# Altium schematic symbol library jlcpcb_2025_04_capacitors_extended_0402.schlib: 3594 symbols (part 17 of 20) (continued)
## GRT155C8YA224KE01D
designator C?  Capacitance: 220nF  (hidden comment: *)
Capacitor, Ceramic (MLCC), 220nF, ±10%, 35V, X6S, ±10%, SMD 0402; Manufacturer: Murata Electronics; Manufacturer Part Number: GRT155C8YA224KE01D; Package Size: 0402; JLCPCB Basic Part: No; JLCPCB Part Number: C711082; Supplier 1: LCSC; Category: Capacitors - MLCC; Supplier Part Number 1: C711082; Tolerance: ±10%; Voltage Rating: 35V; Temperature Coefficient: X6S; RoHS: Yes; ComponentLink1Description: Datasheet; ComponentLink1URL: https://wmsc.lcsc.com/wmsc/upload/file/pdf/v2/lcsc/2108202030_Murata-Electronics-GRT155C8YA224KE01D_C711082.pdf; ComponentLink2Description: JLCPCB Part URL; ComponentLink2URL: https://jlcpcb.com/partdetail/C711082; ComponentLink3Description: LCSC Part URL; ComponentLink3URL: https://lcsc.com/product-detail/Multilayer-Ceramic-Capacitors-MLCC---SMD-SMT_Murata-Electronics-Murata-Electronics-GRT155C8YA224KE01D_C711082.html
footprint CAP-0402 (0402 (1005M) Capacitor)
pins: 1, 2

## GRT155C70J225KE13D
designator C?  Capacitance: 2.2uF  (hidden comment: *)
Capacitor, Ceramic (MLCC), 2.2uF, ±10%, 6.3V, X7S, ±10%, SMD 0402; Manufacturer: Murata Electronics; Manufacturer Part Number: GRT155C70J225KE13D; Package Size: 0402; JLCPCB Basic Part: No; JLCPCB Part Number: C3900266; Supplier 1: LCSC; Category: Capacitors - MLCC; Supplier Part Number 1: C3900266; Tolerance: ±10%; Voltage Rating: 6.3V; Temperature Coefficient: X7S; RoHS: Yes; ComponentLink1Description: Datasheet; ComponentLink1URL: https://wmsc.lcsc.com/wmsc/upload/file/pdf/v2/lcsc/2308111805_Murata-Electronics-GRT155C70J225KE13D_C3900266.pdf; ComponentLink2Description: JLCPCB Part URL; ComponentLink2URL: https://jlcpcb.com/partdetail/C3900266; ComponentLink3Description: LCSC Part URL; ComponentLink3URL: https://lcsc.com/product-detail/Multilayer-Ceramic-Capacitors-MLCC---SMD-SMT_Murata-Electronics-Murata-Electronics-GRT155C70J225KE13D_C3900266.html
footprint CAP-0402 (0402 (1005M) Capacitor)
pins: 1, 2

## GRT155C71A105KE13D
designator C?  Capacitance: 1uF  (hidden comment: *)
Capacitor, Ceramic (MLCC), 1uF, ±10%, 10V, ±10%, SMD 0402; Manufacturer: Murata Electronics; Manufacturer Part Number: GRT155C71A105KE13D; Package Size: 0402; JLCPCB Basic Part: No; JLCPCB Part Number: C711077; Supplier 1: LCSC; Category: Capacitors - MLCC; Supplier Part Number 1: C711077; Tolerance: ±10%; Voltage Rating: 10V; RoHS: Yes; ComponentLink1Description: Datasheet; ComponentLink1URL: https://wmsc.lcsc.com/wmsc/upload/file/pdf/v2/lcsc/2101281807_Murata-Electronics-GRT155C71A105KE13D_C711077.pdf; ComponentLink2Description: JLCPCB Part URL; ComponentLink2URL: https://jlcpcb.com/partdetail/C711077; ComponentLink3Description: LCSC Part URL; ComponentLink3URL: https://lcsc.com/product-detail/Multilayer-Ceramic-Capacitors-MLCC---SMD-SMT_Murata-Electronics-Murata-Electronics-GRT155C71A105KE13D_C711077.html
footprint CAP-0402 (0402 (1005M) Capacitor)
pins: 1, 2

## GRT155C71A225KE13D
designator C?  Capacitance: 2.2uF  (hidden comment: *)
Capacitor, Ceramic (MLCC), 2.2uF, ±10%, 10V, X7S, ±10%, SMD 0402; Manufacturer: Murata Electronics; Manufacturer Part Number: GRT155C71A225KE13D; Package Size: 0402; JLCPCB Basic Part: No; JLCPCB Part Number: C415540; Supplier 1: LCSC; Category: Capacitors - MLCC; Supplier Part Number 1: C415540; Tolerance: ±10%; Voltage Rating: 10V; Temperature Coefficient: X7S; RoHS: Yes; ComponentLink1Description: Datasheet; ComponentLink1URL: https://wmsc.lcsc.com/wmsc/upload/file/pdf/v2/lcsc/1912111437_Murata-Electronics-GRT155C71A225KE13D_C415540.pdf; ComponentLink2Description: JLCPCB Part URL; ComponentLink2URL: https://jlcpcb.com/partdetail/C415540; ComponentLink3Description: LCSC Part URL; ComponentLink3URL: https://lcsc.com/product-detail/Multilayer-Ceramic-Capacitors-MLCC---SMD-SMT_Murata-Electronics-Murata-Electronics-GRT155C71A225KE13D_C415540.html
footprint CAP-0402 (0402 (1005M) Capacitor)
pins: 1, 2

## GRT155C80J225KE01D
designator C?  Capacitance: 2.2uF  (hidden comment: *)
Capacitor, Ceramic (MLCC), 2.2uF, ±10%, 6.3V, X6S, ±10%, SMD 0402; Manufacturer: Murata Electronics; Manufacturer Part Number: GRT155C80J225KE01D; Package Size: 0402; JLCPCB Basic Part: No; JLCPCB Part Number: C711079; Supplier 1: LCSC; Category: Capacitors - MLCC; Supplier Part Number 1: C711079; Tolerance: ±10%; Voltage Rating: 6.3V; Temperature Coefficient: X6S; RoHS: Yes; ComponentLink1Description: Datasheet; ComponentLink1URL: https://wmsc.lcsc.com/wmsc/upload/file/pdf/v2/lcsc/2308111644_Murata-Electronics-GRT155C80J225KE01D_C711079.pdf; ComponentLink2Description: JLCPCB Part URL; ComponentLink2URL: https://jlcpcb.com/partdetail/C711079; ComponentLink3Description: LCSC Part URL; ComponentLink3URL: https://lcsc.com/product-detail/Multilayer-Ceramic-Capacitors-MLCC---SMD-SMT_Murata-Electronics-Murata-Electronics-GRT155C80J225KE01D_C711079.html
footprint CAP-0402 (0402 (1005M) Capacitor)
pins: 1, 2

## GRT155C80J475ME13D
designator C?  Capacitance: 4.7uF  (hidden comment: *)
Capacitor, Ceramic (MLCC), 4.7uF, ±20%, 6.3V, X6S, ±20%, SMD 0402; Manufacturer: Murata Electronics; Manufacturer Part Number: GRT155C80J475ME13D; Package Size: 0402; JLCPCB Basic Part: No; JLCPCB Part Number: C711080; Supplier 1: LCSC; Category: Capacitors - MLCC; Supplier Part Number 1: C711080; Tolerance: ±20%; Voltage Rating: 6.3V; Temperature Coefficient: X6S; RoHS: Yes; ComponentLink1Description: Datasheet; ComponentLink1URL: https://wmsc.lcsc.com/wmsc/upload/file/pdf/v2/lcsc/2108241530_Murata-Electronics-GRT155C80J475ME13D_C711080.pdf; ComponentLink2Description: JLCPCB Part URL; ComponentLink2URL: https://jlcpcb.com/partdetail/C711080; ComponentLink3Description: LCSC Part URL; ComponentLink3URL: https://lcsc.com/product-detail/Multilayer-Ceramic-Capacitors-MLCC---SMD-SMT_Murata-Electronics-Murata-Electronics-GRT155C80J475ME13D_C711080.html
footprint CAP-0402 (0402 (1005M) Capacitor)
pins: 1, 2

## GRT155C81A105KE01D
designator C?  Capacitance: 1uF  (hidden comment: *)
Capacitor, Ceramic (MLCC), 1uF, ±10%, 10V, ±10%, SMD 0402; Manufacturer: Murata Electronics; Manufacturer Part Number: GRT155C81A105KE01D; Package Size: 0402; JLCPCB Basic Part: No; JLCPCB Part Number: C711579; Supplier 1: LCSC; Category: Capacitors - MLCC; Supplier Part Number 1: C711579; Tolerance: ±10%; Voltage Rating: 10V; RoHS: Yes; ComponentLink1Description: Datasheet; ComponentLink1URL: https://wmsc.lcsc.com/wmsc/upload/file/pdf/v2/lcsc/2304140030_Murata-Electronics-GRT155C81A105KE01D_C711579.pdf; ComponentLink2Description: JLCPCB Part URL; ComponentLink2URL: https://jlcpcb.com/partdetail/C711579; ComponentLink3Description: LCSC Part URL; ComponentLink3URL: https://lcsc.com/product-detail/Multilayer-Ceramic-Capacitors-MLCC---SMD-SMT_Murata-Electronics-Murata-Electronics-GRT155C81A105KE01D_C711579.html
footprint CAP-0402 (0402 (1005M) Capacitor)
pins: 1, 2

## GRT155C81C105KE13D
designator C?  Capacitance: 1uF  (hidden comment: *)
Capacitor, Ceramic (MLCC), 1uF, ±10%, 16V, ±10%, SMD 0402; Manufacturer: Murata Electronics; Manufacturer Part Number: GRT155C81C105KE13D; Package Size: 0402; JLCPCB Basic Part: No; JLCPCB Part Number: C908010; Supplier 1: LCSC; Category: Capacitors - MLCC; Supplier Part Number 1: C908010; Tolerance: ±10%; Voltage Rating: 16V; RoHS: Yes; ComponentLink1Description: Datasheet; ComponentLink1URL: https://wmsc.lcsc.com/wmsc/upload/file/pdf/v2/lcsc/2201242100_Murata-Electronics-GRT155C81C105KE13D_C908010.pdf; ComponentLink2Description: JLCPCB Part URL; ComponentLink2URL: https://jlcpcb.com/partdetail/C908010; ComponentLink3Description: LCSC Part URL; ComponentLink3URL: https://lcsc.com/product-detail/Multilayer-Ceramic-Capacitors-MLCC---SMD-SMT_Murata-Electronics-Murata-Electronics-GRT155C81C105KE13D_C908010.html
footprint CAP-0402 (0402 (1005M) Capacitor)
pins: 1, 2

## GRT155C81C225KE13D
designator C?  Capacitance: 2.2uF  (hidden comment: *)
Capacitor, Ceramic (MLCC), 2.2uF, ±10%, 16V, ±10%, SMD 0402; Manufacturer: Murata Electronics; Manufacturer Part Number: GRT155C81C225KE13D; Package Size: 0402; JLCPCB Basic Part: No; JLCPCB Part Number: C668369; Supplier 1: LCSC; Category: Capacitors - MLCC; Supplier Part Number 1: C668369; Tolerance: ±10%; Voltage Rating: 16V; RoHS: Yes; ComponentLink1Description: Datasheet; ComponentLink1URL: https://wmsc.lcsc.com/wmsc/upload/file/pdf/v2/lcsc/2105241313_Murata-Electronics-GRT155C81C225KE13D_C668369.pdf; ComponentLink2Description: JLCPCB Part URL; ComponentLink2URL: https://jlcpcb.com/partdetail/C668369; ComponentLink3Description: LCSC Part URL; ComponentLink3URL: https://lcsc.com/product-detail/Multilayer-Ceramic-Capacitors-MLCC---SMD-SMT_Murata-Electronics-Murata-Electronics-GRT155C81C225KE13D_C668369.html
footprint CAP-0402 (0402 (1005M) Capacitor)
pins: 1, 2

## GRT155C81E105KE13D
designator C?  Capacitance: 1uF  (hidden comment: *)
Capacitor, Ceramic (MLCC), 1uF, ±10%, 25V, ±10%, SMD 0402; Manufacturer: Murata Electronics; Manufacturer Part Number: GRT155C81E105KE13D; Package Size: 0402; JLCPCB Basic Part: No; JLCPCB Part Number: C703147; Supplier 1: LCSC; Category: Capacitors - MLCC; Supplier Part Number 1: C703147; Tolerance: ±10%; Voltage Rating: 25V; RoHS: Yes; ComponentLink1Description: Datasheet; ComponentLink1URL: https://wmsc.lcsc.com/wmsc/upload/file/pdf/v2/lcsc/2308111644_Murata-Electronics-GRT155C81E105KE13D_C703147.pdf; ComponentLink2Description: JLCPCB Part URL; ComponentLink2URL: https://jlcpcb.com/partdetail/C703147; ComponentLink3Description: LCSC Part URL; ComponentLink3URL: https://lcsc.com/product-detail/Multilayer-Ceramic-Capacitors-MLCC---SMD-SMT_Murata-Electronics-Murata-Electronics-GRT155C81E105KE13D_C703147.html
footprint CAP-0402 (0402 (1005M) Capacitor)
pins: 1, 2

## GRT155C81E224KE01D
designator C?  Capacitance: 220nF  (hidden comment: *)
Capacitor, Ceramic (MLCC), 220nF, ±10%, 25V, X6S, ±10%, SMD 0402; Manufacturer: Murata Electronics; Manufacturer Part Number: GRT155C81E224KE01D; Package Size: 0402; JLCPCB Basic Part: No; JLCPCB Part Number: C126623; Supplier 1: LCSC; Category: Capacitors - MLCC; Supplier Part Number 1: C126623; Tolerance: ±10%; Voltage Rating: 25V; Temperature Coefficient: X6S; RoHS: Yes; ComponentLink1Description: Datasheet; ComponentLink1URL: https://wmsc.lcsc.com/wmsc/upload/file/pdf/v2/lcsc/1811081510_Murata-Electronics-GRT155C81E224KE01D_C126623.pdf; ComponentLink2Description: JLCPCB Part URL; ComponentLink2URL: https://jlcpcb.com/partdetail/C126623; ComponentLink3Description: LCSC Part URL; ComponentLink3URL: https://lcsc.com/product-detail/Multilayer-Ceramic-Capacitors-MLCC---SMD-SMT_Murata-Electronics-Murata-Electronics-GRT155C81E224KE01D_C126623.html
footprint CAP-0402 (0402 (1005M) Capacitor)
pins: 1, 2

## GRT155R6YA224KE01D
designator C?  Capacitance: 0.22uF  (hidden comment: *)
Capacitor, Ceramic (MLCC), 0.22uF, ±10%, 35V, X5R, ±10%, SMD 0402; Manufacturer: Murata Electronics; Manufacturer Part Number: GRT155R6YA224KE01D; Package Size: 0402; JLCPCB Basic Part: No; JLCPCB Part Number: C180396; Supplier 1: LCSC; Category: Capacitors - MLCC; Supplier Part Number 1: C180396; Tolerance: ±10%; Voltage Rating: 35V; Temperature Coefficient: X5R; RoHS: Yes; ComponentLink1Description: Datasheet; ComponentLink1URL: https://wmsc.lcsc.com/wmsc/upload/file/pdf/v2/lcsc/2304140030_Murata-Electronics-GRT155R6YA224KE01D_C180396.pdf; ComponentLink2Description: JLCPCB Part URL; ComponentLink2URL: https://jlcpcb.com/partdetail/C180396; ComponentLink3Description: LCSC Part URL; ComponentLink3URL: https://lcsc.com/product-detail/Multilayer-Ceramic-Capacitors-MLCC---SMD-SMT_Murata-Electronics-Murata-Electronics-GRT155R6YA224KE01D_C180396.html
footprint CAP-0402 (0402 (1005M) Capacitor)
pins: 1, 2

## GRT155R6YA474KE01D
designator C?  Capacitance: 470nF  (hidden comment: *)
Capacitor, Ceramic (MLCC), 470nF, ±10%, 35V, X5R, ±10%, SMD 0402; Manufacturer: Murata Electronics; Manufacturer Part Number: GRT155R6YA474KE01D; Package Size: 0402; JLCPCB Basic Part: No; JLCPCB Part Number: C711580; Supplier 1: LCSC; Category: Capacitors - MLCC; Supplier Part Number 1: C711580; Tolerance: ±10%; Voltage Rating: 35V; Temperature Coefficient: X5R; RoHS: Yes; ComponentLink1Description: Datasheet; ComponentLink1URL: https://wmsc.lcsc.com/wmsc/upload/file/pdf/v2/lcsc/2010302040_Murata-Electronics-GRT155R6YA474KE01D_C711580.pdf; ComponentLink2Description: JLCPCB Part URL; ComponentLink2URL: https://jlcpcb.com/partdetail/C711580; ComponentLink3Description: LCSC Part URL; ComponentLink3URL: https://lcsc.com/product-detail/Multilayer-Ceramic-Capacitors-MLCC---SMD-SMT_Murata-Electronics-Murata-Electronics-GRT155R6YA474KE01D_C711580.html
footprint CAP-0402 (0402 (1005M) Capacitor)
pins: 1, 2

## GRT155R60J105KE01D
designator C?  Capacitance: 1uF  (hidden comment: *)
Capacitor, Ceramic (MLCC), 1uF, ±10%, 6.3V, X5R, ±10%, SMD 0402; Manufacturer: Murata Electronics; Manufacturer Part Number: GRT155R60J105KE01D; Package Size: 0402; JLCPCB Basic Part: No; JLCPCB Part Number: C430715; Supplier 1: LCSC; Category: Capacitors - MLCC; Supplier Part Number 1: C430715; Tolerance: ±10%; Voltage Rating: 6.3V; Temperature Coefficient: X5R; RoHS: Yes; ComponentLink1Description: Datasheet; ComponentLink1URL: https://wmsc.lcsc.com/wmsc/upload/file/pdf/v2/lcsc/1912111437_Murata-Electronics-GRT155R60J105KE01D_C430715.pdf; ComponentLink2Description: JLCPCB Part URL; ComponentLink2URL: https://jlcpcb.com/partdetail/C430715; ComponentLink3Description: LCSC Part URL; ComponentLink3URL: https://lcsc.com/product-detail/Multilayer-Ceramic-Capacitors-MLCC---SMD-SMT_Murata-Electronics-Murata-Electronics-GRT155R60J105KE01D_C430715.html
footprint CAP-0402 (0402 (1005M) Capacitor)
pins: 1, 2

## GRT155R60J225KE01D
designator C?  Capacitance: 2.2uF  (hidden comment: *)
Capacitor, Ceramic (MLCC), 2.2uF, ±10%, 6.3V, X5R, ±10%, SMD 0402; Manufacturer: Murata Electronics; Manufacturer Part Number: GRT155R60J225KE01D; Package Size: 0402; JLCPCB Basic Part: No; JLCPCB Part Number: C711083; Supplier 1: LCSC; Category: Capacitors - MLCC; Supplier Part Number 1: C711083; Tolerance: ±10%; Voltage Rating: 6.3V; Temperature Coefficient: X5R; RoHS: Yes; ComponentLink1Description: Datasheet; ComponentLink1URL: https://wmsc.lcsc.com/wmsc/upload/file/pdf/v2/lcsc/2009181536_Murata-Electronics-GRT155R60J225KE01D_C711083.pdf; ComponentLink2Description: JLCPCB Part URL; ComponentLink2URL: https://jlcpcb.com/partdetail/C711083; ComponentLink3Description: LCSC Part URL; ComponentLink3URL: https://lcsc.com/product-detail/Multilayer-Ceramic-Capacitors-MLCC---SMD-SMT_Murata-Electronics-Murata-Electronics-GRT155R60J225KE01D_C711083.html
footprint CAP-0402 (0402 (1005M) Capacitor)
pins: 1, 2

## GRT155R60J475ME13D
designator C?  Capacitance: 4.7uF  (hidden comment: *)
Capacitor, Ceramic (MLCC), 4.7uF, ±20%, 6.3V, X5R, ±20%, SMD 0402; Manufacturer: Murata Electronics; Manufacturer Part Number: GRT155R60J475ME13D; Package Size: 0402; JLCPCB Basic Part: No; JLCPCB Part Number: C126624; Supplier 1: LCSC; Category: Capacitors - MLCC; Supplier Part Number 1: C126624; Tolerance: ±20%; Voltage Rating: 6.3V; Temperature Coefficient: X5R; RoHS: Yes; ComponentLink1Description: Datasheet; ComponentLink1URL: https://wmsc.lcsc.com/wmsc/upload/file/pdf/v2/lcsc/1811081510_Murata-Electronics-GRT155R60J475ME13D_C126624.pdf; ComponentLink2Description: JLCPCB Part URL; ComponentLink2URL: https://jlcpcb.com/partdetail/C126624; ComponentLink3Description: LCSC Part URL; ComponentLink3URL: https://lcsc.com/product-detail/Multilayer-Ceramic-Capacitors-MLCC---SMD-SMT_Murata-Electronics-Murata-Electronics-GRT155R60J475ME13D_C126624.html
footprint CAP-0402 (0402 (1005M) Capacitor)
pins: 1, 2

## GRT155R61A105KE01D
designator C?  Capacitance: 1uF  (hidden comment: *)
Capacitor, Ceramic (MLCC), 1uF, ±10%, 10V, X5R, ±10%, SMD 0402; Manufacturer: Murata Electronics; Manufacturer Part Number: GRT155R61A105KE01D; Package Size: 0402; JLCPCB Basic Part: No; JLCPCB Part Number: C430716; Supplier 1: LCSC; Category: Capacitors - MLCC; Supplier Part Number 1: C430716; Tolerance: ±10%; Voltage Rating: 10V; Temperature Coefficient: X5R; RoHS: Yes; ComponentLink1Description: Datasheet; ComponentLink1URL: https://wmsc.lcsc.com/wmsc/upload/file/pdf/v2/lcsc/1912111437_Murata-Electronics-GRT155R61A105KE01D_C430716.pdf; ComponentLink2Description: JLCPCB Part URL; ComponentLink2URL: https://jlcpcb.com/partdetail/C430716; ComponentLink3Description: LCSC Part URL; ComponentLink3URL: https://lcsc.com/product-detail/Multilayer-Ceramic-Capacitors-MLCC---SMD-SMT_Murata-Electronics-Murata-Electronics-GRT155R61A105KE01D_C430716.html
footprint CAP-0402 (0402 (1005M) Capacitor)
pins: 1, 2

## GRT155R61A225KE01D
designator C?  Capacitance: 2.2uF  (hidden comment: *)
Capacitor, Ceramic (MLCC), 2.2uF, ±10%, 10V, X5R, ±10%, SMD 0402; Manufacturer: Murata Electronics; Manufacturer Part Number: GRT155R61A225KE01D; Package Size: 0402; JLCPCB Basic Part: No; JLCPCB Part Number: C426070; Supplier 1: LCSC; Category: Capacitors - MLCC; Supplier Part Number 1: C426070; Tolerance: ±10%; Voltage Rating: 10V; Temperature Coefficient: X5R; RoHS: Yes; ComponentLink1Description: Datasheet; ComponentLink1URL: https://wmsc.lcsc.com/wmsc/upload/file/pdf/v2/lcsc/2304140030_Murata-Electronics-GRT155R61A225KE01D_C426070.pdf; ComponentLink2Description: JLCPCB Part URL; ComponentLink2URL: https://jlcpcb.com/partdetail/C426070; ComponentLink3Description: LCSC Part URL; ComponentLink3URL: https://lcsc.com/product-detail/Multilayer-Ceramic-Capacitors-MLCC---SMD-SMT_Murata-Electronics-Murata-Electronics-GRT155R61A225KE01D_C426070.html
footprint CAP-0402 (0402 (1005M) Capacitor)
pins: 1, 2

## GRT155R61A475ME13D
designator C?  Capacitance: 4.7uF  (hidden comment: *)
Capacitor, Ceramic (MLCC), 4.7uF, ±20%, 10V, ±20%, SMD 0402; Manufacturer: Murata Electronics; Manufacturer Part Number: GRT155R61A475ME13D; Package Size: 0402; JLCPCB Basic Part: No; JLCPCB Part Number: C426101; Supplier 1: LCSC; Category: Capacitors - MLCC; Supplier Part Number 1: C426101; Tolerance: ±20%; Voltage Rating: 10V; RoHS: Yes; ComponentLink1Description: Datasheet; ComponentLink1URL: https://wmsc.lcsc.com/wmsc/upload/file/pdf/v2/lcsc/2304140030_Murata-Electronics-GRT155R61A475ME13D_C426101.pdf; ComponentLink2Description: JLCPCB Part URL; ComponentLink2URL: https://jlcpcb.com/partdetail/C426101; ComponentLink3Description: LCSC Part URL; ComponentLink3URL: https://lcsc.com/product-detail/Multilayer-Ceramic-Capacitors-MLCC---SMD-SMT_Murata-Electronics-Murata-Electronics-GRT155R61A475ME13D_C426101.html
footprint CAP-0402 (0402 (1005M) Capacitor)
pins: 1, 2

## GRT155R61C105KE01D
designator C?  Capacitance: 1uF  (hidden comment: *)
Capacitor, Ceramic (MLCC), 1uF, ±10%, 16V, X5R, ±10%, SMD 0402; Manufacturer: Murata Electronics; Manufacturer Part Number: GRT155R61C105KE01D; Package Size: 0402; JLCPCB Basic Part: No; JLCPCB Part Number: C363938; Supplier 1: LCSC; Category: Capacitors - MLCC; Supplier Part Number 1: C363938; Tolerance: ±10%; Voltage Rating: 16V; Temperature Coefficient: X5R; RoHS: Yes; ComponentLink1Description: Datasheet; ComponentLink1URL: https://wmsc.lcsc.com/wmsc/upload/file/pdf/v2/lcsc/1912111437_Murata-Electronics-GRT155R61C105KE01D_C363938.pdf; ComponentLink2Description: JLCPCB Part URL; ComponentLink2URL: https://jlcpcb.com/partdetail/C363938; ComponentLink3Description: LCSC Part URL; ComponentLink3URL: https://lcsc.com/product-detail/Multilayer-Ceramic-Capacitors-MLCC---SMD-SMT_Murata-Electronics-Murata-Electronics-GRT155R61C105KE01D_C363938.html
footprint CAP-0402 (0402 (1005M) Capacitor)
pins: 1, 2

## GRT155R61C225KE13D
designator C?  Capacitance: 2.2uF  (hidden comment: *)
Capacitor, Ceramic (MLCC), 2.2uF, ±10%, 16V, X5R, ±10%, SMD 0402; Manufacturer: Murata Electronics; Manufacturer Part Number: GRT155R61C225KE13D; Package Size: 0402; JLCPCB Basic Part: No; JLCPCB Part Number: C711084; Supplier 1: LCSC; Category: Capacitors - MLCC; Supplier Part Number 1: C711084; Tolerance: ±10%; Voltage Rating: 16V; Temperature Coefficient: X5R; RoHS: Yes; ComponentLink1Description: Datasheet; ComponentLink1URL: https://wmsc.lcsc.com/wmsc/upload/file/pdf/v2/lcsc/2206281745_Murata-Electronics-GRT155R61C225KE13D_C711084.pdf; ComponentLink2Description: JLCPCB Part URL; ComponentLink2URL: https://jlcpcb.com/partdetail/C711084; ComponentLink3Description: LCSC Part URL; ComponentLink3URL: https://lcsc.com/product-detail/Multilayer-Ceramic-Capacitors-MLCC---SMD-SMT_Murata-Electronics-Murata-Electronics-GRT155R61C225KE13D_C711084.html
footprint CAP-0402 (0402 (1005M) Capacitor)
pins: 1, 2

## GRT155R61C474KE01D
designator C?  Capacitance: 470nF  (hidden comment: *)
Capacitor, Ceramic (MLCC), 470nF, ±10%, 16V, X5R, ±10%, SMD 0402; Manufacturer: Murata Electronics; Manufacturer Part Number: GRT155R61C474KE01D; Package Size: 0402; JLCPCB Basic Part: No; JLCPCB Part Number: C126625; Supplier 1: LCSC; Category: Capacitors - MLCC; Supplier Part Number 1: C126625; Tolerance: ±10%; Voltage Rating: 16V; Temperature Coefficient: X5R; RoHS: Yes; ComponentLink1Description: Datasheet; ComponentLink1URL: https://wmsc.lcsc.com/wmsc/upload/file/pdf/v2/lcsc/1912111437_Murata-Electronics-GRT155R61C474KE01D_C126625.pdf; ComponentLink2Description: JLCPCB Part URL; ComponentLink2URL: https://jlcpcb.com/partdetail/C126625; ComponentLink3Description: LCSC Part URL; ComponentLink3URL: https://lcsc.com/product-detail/Multilayer-Ceramic-Capacitors-MLCC---SMD-SMT_Murata-Electronics-Murata-Electronics-GRT155R61C474KE01D_C126625.html
footprint CAP-0402 (0402 (1005M) Capacitor)
pins: 1, 2

## GRT155R61E105KE01D
designator C?  Capacitance: 1uF  (hidden comment: *)
Capacitor, Ceramic (MLCC), 1uF, ±10%, 25V, X5R, ±10%, SMD 0402; Manufacturer: Murata Electronics; Manufacturer Part Number: GRT155R61E105KE01D; Package Size: 0402; JLCPCB Basic Part: No; JLCPCB Part Number: C711085; Supplier 1: LCSC; Category: Capacitors - MLCC; Supplier Part Number 1: C711085; Tolerance: ±10%; Voltage Rating: 25V; Temperature Coefficient: X5R; RoHS: Yes; ComponentLink1Description: Datasheet; ComponentLink1URL: https://wmsc.lcsc.com/wmsc/upload/file/pdf/v2/lcsc/2101081033_Murata-Electronics-GRT155R61E105KE01D_C711085.pdf; ComponentLink2Description: JLCPCB Part URL; ComponentLink2URL: https://jlcpcb.com/partdetail/C711085; ComponentLink3Description: LCSC Part URL; ComponentLink3URL: https://lcsc.com/product-detail/Multilayer-Ceramic-Capacitors-MLCC---SMD-SMT_Murata-Electronics-Murata-Electronics-GRT155R61E105KE01D_C711085.html
footprint CAP-0402 (0402 (1005M) Capacitor)
pins: 1, 2

## GRT155R61E224KE01D
designator C?  Capacitance: 220nF  (hidden comment: *)
Capacitor, Ceramic (MLCC), 220nF, ±10%, 25V, ±10%, SMD 0402; Manufacturer: Murata Electronics; Manufacturer Part Number: GRT155R61E224KE01D; Package Size: 0402; JLCPCB Basic Part: No; JLCPCB Part Number: C180397; Supplier 1: LCSC; Category: Capacitors - MLCC; Supplier Part Number 1: C180397; Tolerance: ±10%; Voltage Rating: 25V; RoHS: Yes; ComponentLink1Description: Datasheet; ComponentLink1URL: https://wmsc.lcsc.com/wmsc/upload/file/pdf/v2/lcsc/2009081704_Murata-Electronics-GRT155R61E224KE01D_C180397.pdf; ComponentLink2Description: JLCPCB Part URL; ComponentLink2URL: https://jlcpcb.com/partdetail/C180397; ComponentLink3Description: LCSC Part URL; ComponentLink3URL: https://lcsc.com/product-detail/Multilayer-Ceramic-Capacitors-MLCC---SMD-SMT_Murata-Electronics-Murata-Electronics-GRT155R61E224KE01D_C180397.html
footprint CAP-0402 (0402 (1005M) Capacitor)
pins: 1, 2

## GRT155R61E225KE13D
designator C?  Capacitance: 2.2uF  (hidden comment: *)
Capacitor, Ceramic (MLCC), 2.2uF, ±10%, 25V, X5R, ±10%, SMD 0402; Manufacturer: Murata Electronics; Manufacturer Part Number: GRT155R61E225KE13D; Package Size: 0402; JLCPCB Basic Part: No; JLCPCB Part Number: C711086; Supplier 1: LCSC; Category: Capacitors - MLCC; Supplier Part Number 1: C711086; Tolerance: ±10%; Voltage Rating: 25V; Temperature Coefficient: X5R; RoHS: Yes; ComponentLink1Description: Datasheet; ComponentLink1URL: https://wmsc.lcsc.com/wmsc/upload/file/pdf/v2/lcsc/2308111644_Murata-Electronics-GRT155R61E225KE13D_C711086.pdf; ComponentLink2Description: JLCPCB Part URL; ComponentLink2URL: https://jlcpcb.com/partdetail/C711086; ComponentLink3Description: LCSC Part URL; ComponentLink3URL: https://lcsc.com/product-detail/Multilayer-Ceramic-Capacitors-MLCC---SMD-SMT_Murata-Electronics-Murata-Electronics-GRT155R61E225KE13D_C711086.html
footprint CAP-0402 (0402 (1005M) Capacitor)
pins: 1, 2

## GRT155R61E474KE01D
designator C?  Capacitance: 470nF  (hidden comment: *)
Capacitor, Ceramic (MLCC), 470nF, ±10%, 25V, X5R, ±10%, SMD 0402; Manufacturer: Murata Electronics; Manufacturer Part Number: GRT155R61E474KE01D; Package Size: 0402; JLCPCB Basic Part: No; JLCPCB Part Number: C782164; Supplier 1: LCSC; Category: Capacitors - MLCC; Supplier Part Number 1: C782164; Tolerance: ±10%; Voltage Rating: 25V; Temperature Coefficient: X5R; RoHS: Yes; ComponentLink1Description: Datasheet; ComponentLink1URL: https://wmsc.lcsc.com/wmsc/upload/file/pdf/v2/lcsc/2009161209_Murata-Electronics-GRT155R61E474KE01D_C782164.pdf; ComponentLink2Description: JLCPCB Part URL; ComponentLink2URL: https://jlcpcb.com/partdetail/C782164; ComponentLink3Description: LCSC Part URL; ComponentLink3URL: https://lcsc.com/product-detail/Multilayer-Ceramic-Capacitors-MLCC---SMD-SMT_Murata-Electronics-Murata-Electronics-GRT155R61E474KE01D_C782164.html
footprint CAP-0402 (0402 (1005M) Capacitor)
pins: 1, 2

## GRT155R70J105KE01D
designator C?  Capacitance: 1uF  (hidden comment: *)
Capacitor, Ceramic (MLCC), 1uF, ±10%, 6.3V, ±10%, SMD 0402; Manufacturer: Murata Electronics; Manufacturer Part Number: GRT155R70J105KE01D; Package Size: 0402; JLCPCB Basic Part: No; JLCPCB Part Number: C711581; Supplier 1: LCSC; Category: Capacitors - MLCC; Supplier Part Number 1: C711581; Tolerance: ±10%; Voltage Rating: 6.3V; RoHS: Yes; ComponentLink1Description: Datasheet; ComponentLink1URL: https://wmsc.lcsc.com/wmsc/upload/file/pdf/v2/lcsc/2009261437_Murata-Electronics-GRT155R70J105KE01D_C711581.pdf; ComponentLink2Description: JLCPCB Part URL; ComponentLink2URL: https://jlcpcb.com/partdetail/C711581; ComponentLink3Description: LCSC Part URL; ComponentLink3URL: https://lcsc.com/product-detail/Multilayer-Ceramic-Capacitors-MLCC---SMD-SMT_Murata-Electronics-Murata-Electronics-GRT155R70J105KE01D_C711581.html
footprint CAP-0402 (0402 (1005M) Capacitor)
pins: 1, 2

## GRT155R71A474KE01D
designator C?  Capacitance: 470nF  (hidden comment: *)
Capacitor, Ceramic (MLCC), 470nF, ±10%, 10V, X7R, ±10%, SMD 0402; Manufacturer: Murata Electronics; Manufacturer Part Number: GRT155R71A474KE01D; Package Size: 0402; JLCPCB Basic Part: No; JLCPCB Part Number: C711087; Supplier 1: LCSC; Category: Capacitors - MLCC; Supplier Part Number 1: C711087; Tolerance: ±10%; Voltage Rating: 10V; Temperature Coefficient: X7R; RoHS: Yes; ComponentLink1Description: Datasheet; ComponentLink1URL: https://wmsc.lcsc.com/wmsc/upload/file/pdf/v2/lcsc/2206281830_Murata-Electronics-GRT155R71A474KE01D_C711087.pdf; ComponentLink2Description: JLCPCB Part URL; ComponentLink2URL: https://jlcpcb.com/partdetail/C711087; ComponentLink3Description: LCSC Part URL; ComponentLink3URL: https://lcsc.com/product-detail/Multilayer-Ceramic-Capacitors-MLCC---SMD-SMT_Murata-Electronics-Murata-Electronics-GRT155R71A474KE01D_C711087.html
footprint CAP-0402 (0402 (1005M) Capacitor)
pins: 1, 2

## GRT155R71C104KE01D
designator C?  Capacitance: 100nF  (hidden comment: *)
Capacitor, Ceramic (MLCC), 100nF, ±10%, 16V, ±10%, SMD 0402; Manufacturer: Murata Electronics; Manufacturer Part Number: GRT155R71C104KE01D; Package Size: 0402; JLCPCB Basic Part: No; JLCPCB Part Number: C711088; Supplier 1: LCSC; Category: Capacitors - MLCC; Supplier Part Number 1: C711088; Tolerance: ±10%; Voltage Rating: 16V; RoHS: Yes; ComponentLink1Description: Datasheet; ComponentLink1URL: https://wmsc.lcsc.com/wmsc/upload/file/pdf/v2/lcsc/2009181536_Murata-Electronics-GRT155R71C104KE01D_C711088.pdf; ComponentLink2Description: JLCPCB Part URL; ComponentLink2URL: https://jlcpcb.com/partdetail/C711088; ComponentLink3Description: LCSC Part URL; ComponentLink3URL: https://lcsc.com/product-detail/Multilayer-Ceramic-Capacitors-MLCC---SMD-SMT_Murata-Electronics-Murata-Electronics-GRT155R71C104KE01D_C711088.html
footprint CAP-0402 (0402 (1005M) Capacitor)
pins: 1, 2

## GRT155R71H102KE01D
designator C?  Capacitance: 1000pF  (hidden comment: *)
Capacitor, Ceramic (MLCC), 1000pF, ±10%, null, X7R, ±10%, SMD 0402; Manufacturer: Murata Electronics; Manufacturer Part Number: GRT155R71H102KE01D; Package Size: 0402; JLCPCB Basic Part: No; JLCPCB Part Number: C711089; Supplier 1: LCSC; Category: Capacitors - MLCC; Supplier Part Number 1: C711089; Tolerance: ±10%; Voltage Rating: null; Temperature Coefficient: X7R; RoHS: Yes; ComponentLink1Description: Datasheet; ComponentLink1URL: https://wmsc.lcsc.com/wmsc/upload/file/pdf/v2/lcsc/2308111644_Murata-Electronics-GRT155R71H102KE01D_C711089.pdf; ComponentLink2Description: JLCPCB Part URL; ComponentLink2URL: https://jlcpcb.com/partdetail/C711089; ComponentLink3Description: LCSC Part URL; ComponentLink3URL: https://lcsc.com/product-detail/Multilayer-Ceramic-Capacitors-MLCC---SMD-SMT_Murata-Electronics-Murata-Electronics-GRT155R71H102KE01D_C711089.html
footprint CAP-0402 (0402 (1005M) Capacitor)
pins: 1, 2

## GRT155R71H103KE01D
designator C?  Capacitance: 10nF  (hidden comment: *)
Capacitor, Ceramic (MLCC), 10nF, ±10%, null, X7R, ±10%, SMD 0402; Manufacturer: Murata Electronics; Manufacturer Part Number: GRT155R71H103KE01D; Package Size: 0402; JLCPCB Basic Part: No; JLCPCB Part Number: C711090; Supplier 1: LCSC; Category: Capacitors - MLCC; Supplier Part Number 1: C711090; Tolerance: ±10%; Voltage Rating: null; Temperature Coefficient: X7R; RoHS: Yes; ComponentLink1Description: Datasheet; ComponentLink1URL: https://wmsc.lcsc.com/wmsc/upload/file/pdf/v2/lcsc/2009181536_Murata-Electronics-GRT155R71H103KE01D_C711090.pdf; ComponentLink2Description: JLCPCB Part URL; ComponentLink2URL: https://jlcpcb.com/partdetail/C711090; ComponentLink3Description: LCSC Part URL; ComponentLink3URL: https://lcsc.com/product-detail/Multilayer-Ceramic-Capacitors-MLCC---SMD-SMT_Murata-Electronics-Murata-Electronics-GRT155R71H103KE01D_C711090.html
footprint CAP-0402 (0402 (1005M) Capacitor)
pins: 1, 2

## GRT155R71H104KE01D
designator C?  Capacitance: 100nF  (hidden comment: *)
Capacitor, Ceramic (MLCC), 100nF, ±10%, null, ±10%, SMD 0402; Manufacturer: Murata Electronics; Manufacturer Part Number: GRT155R71H104KE01D; Package Size: 0402; JLCPCB Basic Part: No; JLCPCB Part Number: C711091; Supplier 1: LCSC; Category: Capacitors - MLCC; Supplier Part Number 1: C711091; Tolerance: ±10%; Voltage Rating: null; RoHS: Yes; ComponentLink1Description: Datasheet; ComponentLink1URL: https://wmsc.lcsc.com/wmsc/upload/file/pdf/v2/lcsc/2009181536_Murata-Electronics-GRT155R71H104KE01D_C711091.pdf; ComponentLink2Description: JLCPCB Part URL; ComponentLink2URL: https://jlcpcb.com/partdetail/C711091; ComponentLink3Description: LCSC Part URL; ComponentLink3URL: https://lcsc.com/product-detail/Multilayer-Ceramic-Capacitors-MLCC---SMD-SMT_Murata-Electronics-Murata-Electronics-GRT155R71H104KE01D_C711091.html
footprint CAP-0402 (0402 (1005M) Capacitor)
pins: 1, 2

## GRT155R71H152KE01D
designator C?  Capacitance: 1.5nF  (hidden comment: *)
Capacitor, Ceramic (MLCC), 1.5nF, ±10%, 50V, X7R, ±10%, SMD 0402; Manufacturer: Murata Electronics; Manufacturer Part Number: GRT155R71H152KE01D; Package Size: 0402; JLCPCB Basic Part: No; JLCPCB Part Number: C782166; Supplier 1: LCSC; Category: Capacitors - MLCC; Supplier Part Number 1: C782166; Tolerance: ±10%; Voltage Rating: 50V; Temperature Coefficient: X7R; RoHS: Yes; ComponentLink1Description: Datasheet; ComponentLink1URL: https://wmsc.lcsc.com/wmsc/upload/file/pdf/v2/lcsc/2009161209_Murata-Electronics-GRT155R71H152KE01D_C782166.pdf; ComponentLink2Description: JLCPCB Part URL; ComponentLink2URL: https://jlcpcb.com/partdetail/C782166; ComponentLink3Description: LCSC Part URL; ComponentLink3URL: https://lcsc.com/product-detail/Multilayer-Ceramic-Capacitors-MLCC---SMD-SMT_Murata-Electronics-Murata-Electronics-GRT155R71H152KE01D_C782166.html
footprint CAP-0402 (0402 (1005M) Capacitor)
pins: 1, 2

## GRT155R71H222KE01D
designator C?  Capacitance: 2.2nF  (hidden comment: *)
Capacitor, Ceramic (MLCC), 2.2nF, ±10%, null, ±10%, SMD 0402; Manufacturer: Murata Electronics; Manufacturer Part Number: GRT155R71H222KE01D; Package Size: 0402; JLCPCB Basic Part: No; JLCPCB Part Number: C782167; Supplier 1: LCSC; Category: Capacitors - MLCC; Supplier Part Number 1: C782167; Tolerance: ±10%; Voltage Rating: null; RoHS: Yes; ComponentLink1Description: Datasheet; ComponentLink1URL: https://wmsc.lcsc.com/wmsc/upload/file/pdf/v2/lcsc/2009161209_Murata-Electronics-GRT155R71H222KE01D_C782167.pdf; ComponentLink2Description: JLCPCB Part URL; ComponentLink2URL: https://jlcpcb.com/partdetail/C782167; ComponentLink3Description: LCSC Part URL; ComponentLink3URL: https://lcsc.com/product-detail/Multilayer-Ceramic-Capacitors-MLCC---SMD-SMT_Murata-Electronics-Murata-Electronics-GRT155R71H222KE01D_C782167.html
footprint CAP-0402 (0402 (1005M) Capacitor)
pins: 1, 2

## GRT155R71H223KE01D
designator C?  Capacitance: 22nF  (hidden comment: *)
Capacitor, Ceramic (MLCC), 22nF, ±10%, null, X7R, ±10%, SMD 0402; Manufacturer: Murata Electronics; Manufacturer Part Number: GRT155R71H223KE01D; Package Size: 0402; JLCPCB Basic Part: No; JLCPCB Part Number: C711092; Supplier 1: LCSC; Category: Capacitors - MLCC; Supplier Part Number 1: C711092; Tolerance: ±10%; Voltage Rating: null; Temperature Coefficient: X7R; RoHS: Yes; ComponentLink1Description: Datasheet; ComponentLink1URL: https://wmsc.lcsc.com/wmsc/upload/file/pdf/v2/lcsc/2009181536_Murata-Electronics-GRT155R71H223KE01D_C711092.pdf; ComponentLink2Description: JLCPCB Part URL; ComponentLink2URL: https://jlcpcb.com/partdetail/C711092; ComponentLink3Description: LCSC Part URL; ComponentLink3URL: https://lcsc.com/product-detail/Multilayer-Ceramic-Capacitors-MLCC---SMD-SMT_Murata-Electronics-Murata-Electronics-GRT155R71H223KE01D_C711092.html
footprint CAP-0402 (0402 (1005M) Capacitor)
pins: 1, 2

## GRT155R71H332KE01D
designator C?  Capacitance: 3.3nF  (hidden comment: *)
Capacitor, Ceramic (MLCC), 3.3nF, ±10%, null, ±10%, SMD 0402; Manufacturer: Murata Electronics; Manufacturer Part Number: GRT155R71H332KE01D; Package Size: 0402; JLCPCB Basic Part: No; JLCPCB Part Number: C782168; Supplier 1: LCSC; Category: Capacitors - MLCC; Supplier Part Number 1: C782168; Tolerance: ±10%; Voltage Rating: null; RoHS: Yes; ComponentLink1Description: Datasheet; ComponentLink1URL: https://wmsc.lcsc.com/wmsc/upload/file/pdf/v2/lcsc/2009161209_Murata-Electronics-GRT155R71H332KE01D_C782168.pdf; ComponentLink2Description: JLCPCB Part URL; ComponentLink2URL: https://jlcpcb.com/partdetail/C782168; ComponentLink3Description: LCSC Part URL; ComponentLink3URL: https://lcsc.com/product-detail/Multilayer-Ceramic-Capacitors-MLCC---SMD-SMT_Murata-Electronics-Murata-Electronics-GRT155R71H332KE01D_C782168.html
footprint CAP-0402 (0402 (1005M) Capacitor)
pins: 1, 2

## GRT155R71H473KE01D
designator C?  Capacitance: 47nF  (hidden comment: *)
Capacitor, Ceramic (MLCC), 47nF, ±10%, null, ±10%, SMD 0402; Manufacturer: Murata Electronics; Manufacturer Part Number: GRT155R71H473KE01D; Package Size: 0402; JLCPCB Basic Part: No; JLCPCB Part Number: C782169; Supplier 1: LCSC; Category: Capacitors - MLCC; Supplier Part Number 1: C782169; Tolerance: ±10%; Voltage Rating: null; RoHS: Yes; ComponentLink1Description: Datasheet; ComponentLink1URL: https://wmsc.lcsc.com/wmsc/upload/file/pdf/v2/lcsc/2009161209_Murata-Electronics-GRT155R71H473KE01D_C782169.pdf; ComponentLink2Description: JLCPCB Part URL; ComponentLink2URL: https://jlcpcb.com/partdetail/C782169; ComponentLink3Description: LCSC Part URL; ComponentLink3URL: https://lcsc.com/product-detail/Multilayer-Ceramic-Capacitors-MLCC---SMD-SMT_Murata-Electronics-Murata-Electronics-GRT155R71H473KE01D_C782169.html
footprint CAP-0402 (0402 (1005M) Capacitor)
pins: 1, 2

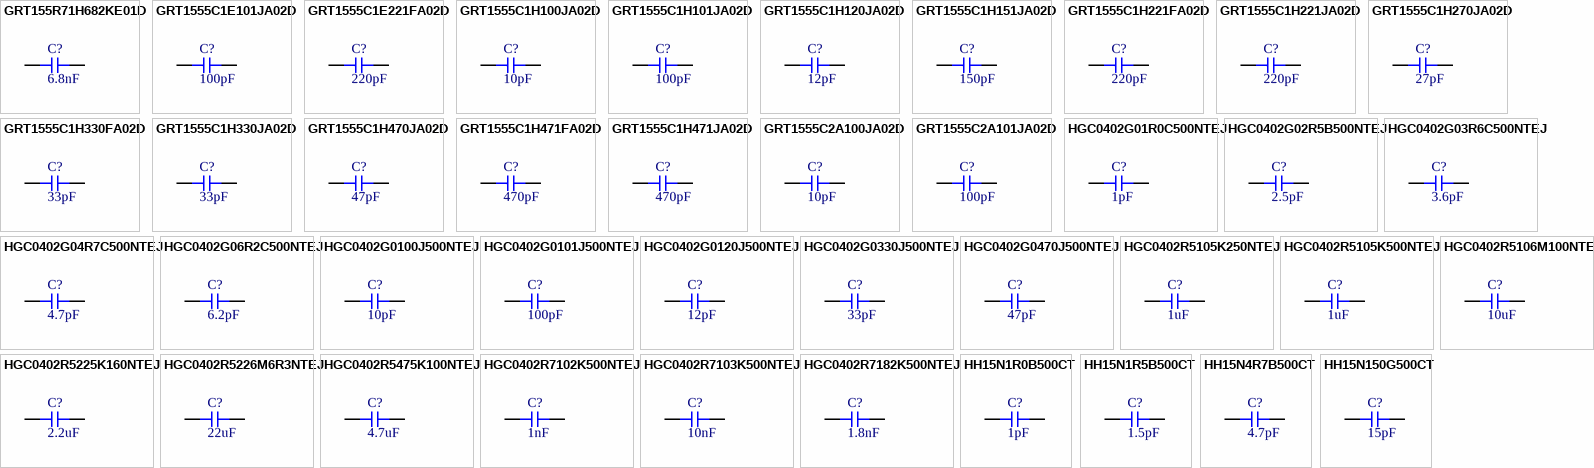
[diagram p76: symbols GRT155R71H682KE01D to HH15N150G500CT]

## GRT155R71H682KE01D
designator C?  Capacitance: 6.8nF  (hidden comment: *)
Capacitor, Ceramic (MLCC), 6.8nF, ±10%, 50V, X7R, ±10%, SMD 0402; Manufacturer: Murata Electronics; Manufacturer Part Number: GRT155R71H682KE01D; Package Size: 0402; JLCPCB Basic Part: No; JLCPCB Part Number: C782170; Supplier 1: LCSC; Category: Capacitors - MLCC; Supplier Part Number 1: C782170; Tolerance: ±10%; Voltage Rating: 50V; Temperature Coefficient: X7R; RoHS: Yes; ComponentLink1Description: Datasheet; ComponentLink1URL: https://wmsc.lcsc.com/wmsc/upload/file/pdf/v2/lcsc/2009161209_Murata-Electronics-GRT155R71H682KE01D_C782170.pdf; ComponentLink2Description: JLCPCB Part URL; ComponentLink2URL: https://jlcpcb.com/partdetail/C782170; ComponentLink3Description: LCSC Part URL; ComponentLink3URL: https://lcsc.com/product-detail/Multilayer-Ceramic-Capacitors-MLCC---SMD-SMT_Murata-Electronics-Murata-Electronics-GRT155R71H682KE01D_C782170.html
footprint CAP-0402 (0402 (1005M) Capacitor)
pins: 1, 2

## GRT1555C1E101JA02D
designator C?  Capacitance: 100pF  (hidden comment: *)
Capacitor, Ceramic (MLCC), 100pF, ±5%, 25V, C0G, ±5%, SMD 0402; Manufacturer: Murata Electronics; Manufacturer Part Number: GRT1555C1E101JA02D; Package Size: 0402; JLCPCB Basic Part: No; JLCPCB Part Number: C3833459; Supplier 1: LCSC; Category: Capacitors - MLCC; Supplier Part Number 1: C3833459; Tolerance: ±5%; Voltage Rating: 25V; Temperature Coefficient: C0G; RoHS: Yes; ComponentLink1Description: Datasheet; ComponentLink1URL: https://wmsc.lcsc.com/wmsc/upload/file/pdf/v2/lcsc/2308111523_Murata-Electronics-GRT1555C1E101JA02D_C3833459.pdf; ComponentLink2Description: JLCPCB Part URL; ComponentLink2URL: https://jlcpcb.com/partdetail/C3833459; ComponentLink3Description: LCSC Part URL; ComponentLink3URL: https://lcsc.com/product-detail/Multilayer-Ceramic-Capacitors-MLCC---SMD-SMT_Murata-Electronics-Murata-Electronics-GRT1555C1E101JA02D_C3833459.html
footprint CAP-0402 (0402 (1005M) Capacitor)
pins: 1, 2

## GRT1555C1E221FA02D
designator C?  Capacitance: 220pF  (hidden comment: *)
Capacitor, Ceramic (MLCC), 220pF, ±1%, 25V, C0G, ±1%, SMD 0402; Manufacturer: Murata Electronics; Manufacturer Part Number: GRT1555C1E221FA02D; Package Size: 0402; JLCPCB Basic Part: No; JLCPCB Part Number: C3876365; Supplier 1: LCSC; Category: Capacitors - MLCC; Supplier Part Number 1: C3876365; Tolerance: ±1%; Voltage Rating: 25V; Temperature Coefficient: C0G; RoHS: Yes; ComponentLink1Description: Datasheet; ComponentLink1URL: https://wmsc.lcsc.com/wmsc/upload/file/pdf/v2/lcsc/2308111523_Murata-Electronics-GRT1555C1E221FA02D_C3876365.pdf; ComponentLink2Description: JLCPCB Part URL; ComponentLink2URL: https://jlcpcb.com/partdetail/C3876365; ComponentLink3Description: LCSC Part URL; ComponentLink3URL: https://lcsc.com/product-detail/Multilayer-Ceramic-Capacitors-MLCC---SMD-SMT_Murata-Electronics-Murata-Electronics-GRT1555C1E221FA02D_C3876365.html
footprint CAP-0402 (0402 (1005M) Capacitor)
pins: 1, 2

## GRT1555C1H100JA02D
designator C?  Capacitance: 10pF  (hidden comment: *)
Capacitor, Ceramic (MLCC), 10pF, ±5%, null, ±5%, SMD 0402; Manufacturer: Murata Electronics; Manufacturer Part Number: GRT1555C1H100JA02D; Package Size: 0402; JLCPCB Basic Part: No; JLCPCB Part Number: C782158; Supplier 1: LCSC; Category: Capacitors - MLCC; Supplier Part Number 1: C782158; Tolerance: ±5%; Voltage Rating: null; RoHS: Yes; ComponentLink1Description: Datasheet; ComponentLink1URL: https://wmsc.lcsc.com/wmsc/upload/file/pdf/v2/lcsc/2009161209_Murata-Electronics-GRT1555C1H100JA02D_C782158.pdf; ComponentLink2Description: JLCPCB Part URL; ComponentLink2URL: https://jlcpcb.com/partdetail/C782158; ComponentLink3Description: LCSC Part URL; ComponentLink3URL: https://lcsc.com/product-detail/Multilayer-Ceramic-Capacitors-MLCC---SMD-SMT_Murata-Electronics-Murata-Electronics-GRT1555C1H100JA02D_C782158.html
footprint CAP-0402 (0402 (1005M) Capacitor)
pins: 1, 2

## GRT1555C1H101JA02D
designator C?  Capacitance: 100pF  (hidden comment: *)
Capacitor, Ceramic (MLCC), 100pF, ±5%, null, ±5%, SMD 0402; Manufacturer: Murata Electronics; Manufacturer Part Number: GRT1555C1H101JA02D; Package Size: 0402; JLCPCB Basic Part: No; JLCPCB Part Number: C711072; Supplier 1: LCSC; Category: Capacitors - MLCC; Supplier Part Number 1: C711072; Tolerance: ±5%; Voltage Rating: null; RoHS: Yes; ComponentLink1Description: Datasheet; ComponentLink1URL: https://wmsc.lcsc.com/wmsc/upload/file/pdf/v2/lcsc/2009181536_Murata-Electronics-GRT1555C1H101JA02D_C711072.pdf; ComponentLink2Description: JLCPCB Part URL; ComponentLink2URL: https://jlcpcb.com/partdetail/C711072; ComponentLink3Description: LCSC Part URL; ComponentLink3URL: https://lcsc.com/product-detail/Multilayer-Ceramic-Capacitors-MLCC---SMD-SMT_Murata-Electronics-Murata-Electronics-GRT1555C1H101JA02D_C711072.html
footprint CAP-0402 (0402 (1005M) Capacitor)
pins: 1, 2

## GRT1555C1H120JA02D
designator C?  Capacitance: 12pF  (hidden comment: *)
Capacitor, Ceramic (MLCC), 12pF, ±5%, null, ±5%, SMD 0402; Manufacturer: Murata Electronics; Manufacturer Part Number: GRT1555C1H120JA02D; Package Size: 0402; JLCPCB Basic Part: No; JLCPCB Part Number: C782159; Supplier 1: LCSC; Category: Capacitors - MLCC; Supplier Part Number 1: C782159; Tolerance: ±5%; Voltage Rating: null; RoHS: Yes; ComponentLink1Description: Datasheet; ComponentLink1URL: https://wmsc.lcsc.com/wmsc/upload/file/pdf/v2/lcsc/2009161209_Murata-Electronics-GRT1555C1H120JA02D_C782159.pdf; ComponentLink2Description: JLCPCB Part URL; ComponentLink2URL: https://jlcpcb.com/partdetail/C782159; ComponentLink3Description: LCSC Part URL; ComponentLink3URL: https://lcsc.com/product-detail/Multilayer-Ceramic-Capacitors-MLCC---SMD-SMT_Murata-Electronics-Murata-Electronics-GRT1555C1H120JA02D_C782159.html
footprint CAP-0402 (0402 (1005M) Capacitor)
pins: 1, 2

## GRT1555C1H151JA02D
designator C?  Capacitance: 150pF  (hidden comment: *)
Capacitor, Ceramic (MLCC), 150pF, ±5%, null, ±5%, SMD 0402; Manufacturer: Murata Electronics; Manufacturer Part Number: GRT1555C1H151JA02D; Package Size: 0402; JLCPCB Basic Part: No; JLCPCB Part Number: C711075; Supplier 1: LCSC; Category: Capacitors - MLCC; Supplier Part Number 1: C711075; Tolerance: ±5%; Voltage Rating: null; RoHS: Yes; ComponentLink1Description: Datasheet; ComponentLink1URL: https://wmsc.lcsc.com/wmsc/upload/file/pdf/v2/lcsc/2105071233_Murata-Electronics-GRT1555C1H151JA02D_C711075.pdf; ComponentLink2Description: JLCPCB Part URL; ComponentLink2URL: https://jlcpcb.com/partdetail/C711075; ComponentLink3Description: LCSC Part URL; ComponentLink3URL: https://lcsc.com/product-detail/Multilayer-Ceramic-Capacitors-MLCC---SMD-SMT_Murata-Electronics-Murata-Electronics-GRT1555C1H151JA02D_C711075.html
footprint CAP-0402 (0402 (1005M) Capacitor)
pins: 1, 2

## GRT1555C1H221FA02D
designator C?  Capacitance: 220pF  (hidden comment: *)
Capacitor, Ceramic (MLCC), 220pF, ±1%, 50V, C0G, ±1%, SMD 0402; Manufacturer: Murata Electronics; Manufacturer Part Number: GRT1555C1H221FA02D; Package Size: 0402; JLCPCB Basic Part: No; JLCPCB Part Number: C3831616; Supplier 1: LCSC; Category: Capacitors - MLCC; Supplier Part Number 1: C3831616; Tolerance: ±1%; Voltage Rating: 50V; Temperature Coefficient: C0G; RoHS: Yes; ComponentLink1Description: Datasheet; ComponentLink1URL: https://wmsc.lcsc.com/wmsc/upload/file/pdf/v2/lcsc/2308111740_Murata-Electronics-GRT1555C1H221FA02D_C3831616.pdf; ComponentLink2Description: JLCPCB Part URL; ComponentLink2URL: https://jlcpcb.com/partdetail/C3831616; ComponentLink3Description: LCSC Part URL; ComponentLink3URL: https://lcsc.com/product-detail/Multilayer-Ceramic-Capacitors-MLCC---SMD-SMT_Murata-Electronics-Murata-Electronics-GRT1555C1H221FA02D_C3831616.html
footprint CAP-0402 (0402 (1005M) Capacitor)
pins: 1, 2
